# Altium footprint library ESKDPcbLib.PcbLib: 608 footprints (part 22 of 38)
Each footprint in its own frame and in the unit in brackets; x right, y up, seen from the top. Pads: shape width x height; smd on the part's side, far side on the other; paste and mask are expansions set on the pad; w line width, h text height; cw(c..) or ccw(c..) is an arc to the next point about the centre after c.
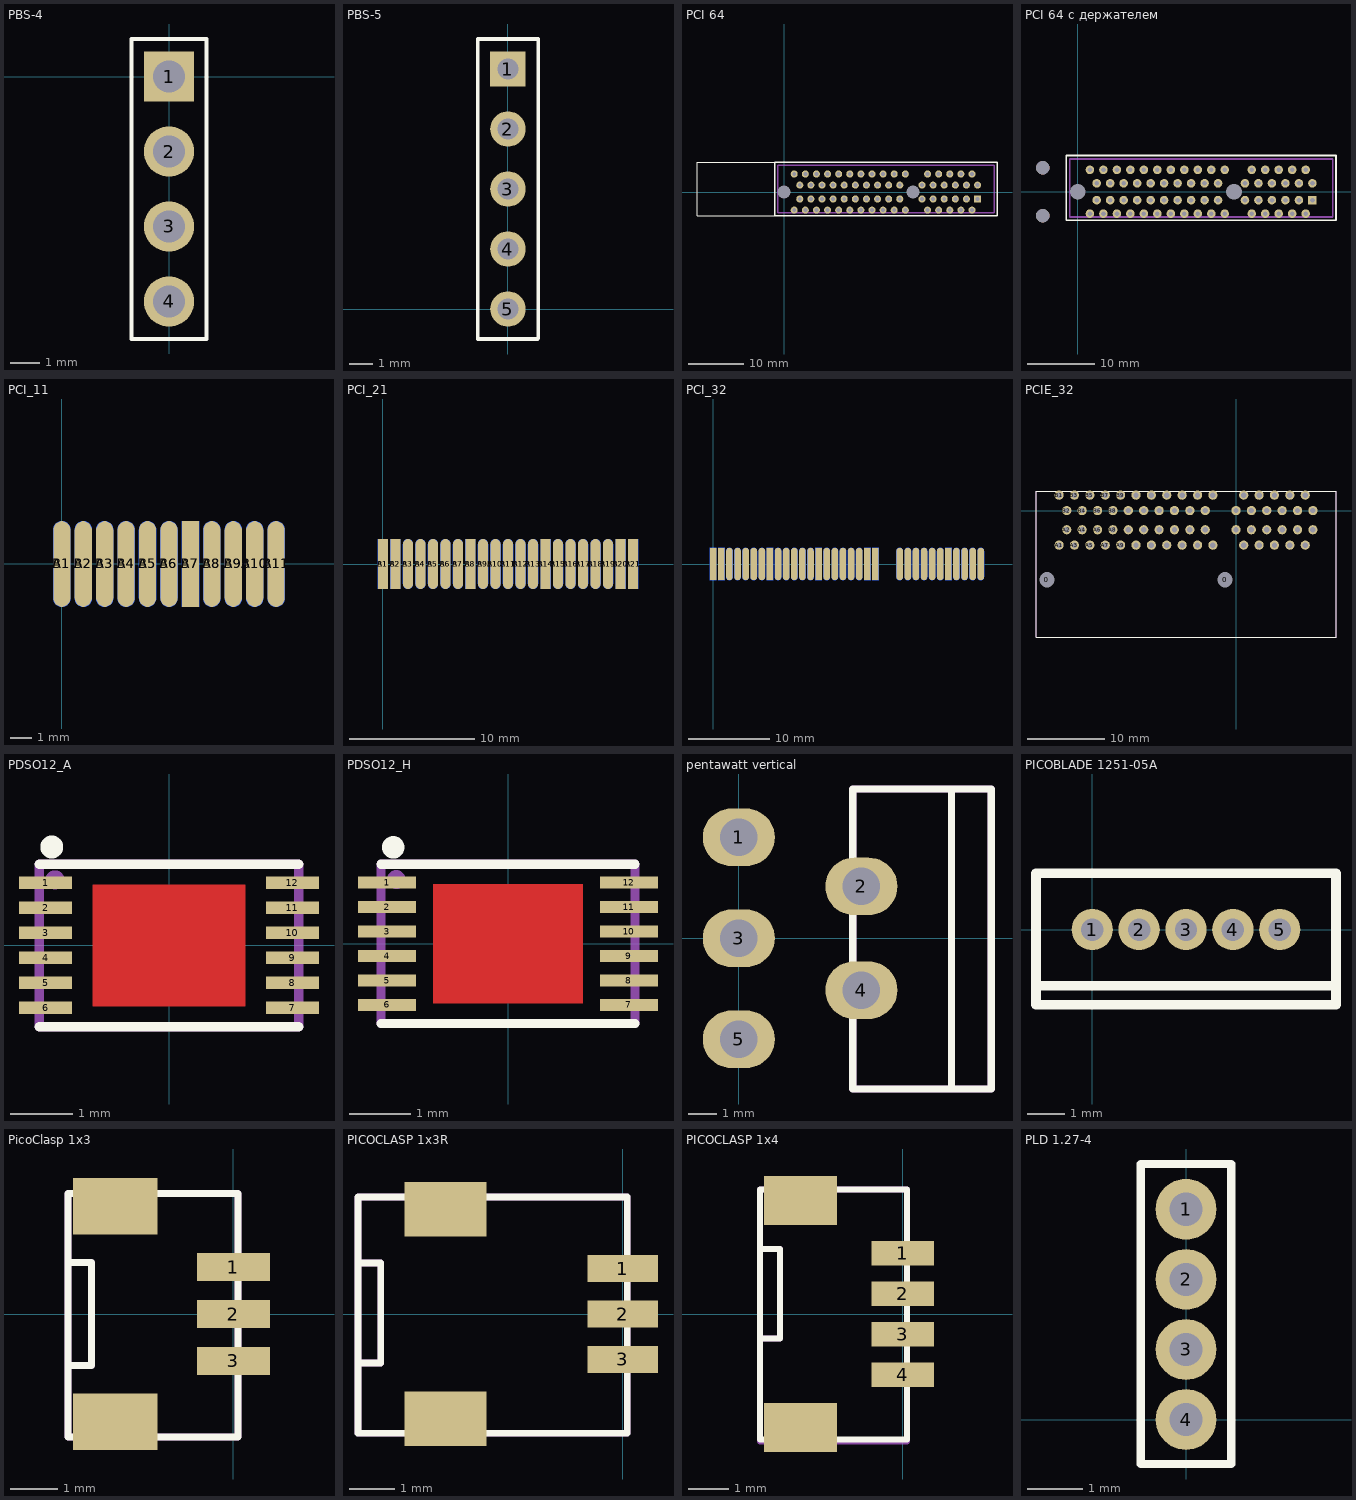
[diagram p21: the footprints below, top view; thin cyan lines are the x and y axes]

## PBS-4 [mm]
pads (4):
  rect 1.7x1.7 hole 1.1: 1(0,0)
  round 1.7 hole 1.1: 2(0,-2.54) 3(0,-5.08) 4(0,-7.62)
Top Overlay:
  lines w0.15: -1.27,-8.89 1.27,-8.89 1.27,1.27 -1.27,1.27 -1.27,-8.89
Mechanical 7:
  lines w0.1: -1.27,-8.89 1.27,-8.89 1.27,1.27 -1.27,1.27 -1.27,-8.89
Mechanical 10:
  text ".Designator" at -1.27,2.54 h1
  text ".Comment" at -1.27,3.81 h1
3D body: height 8.5, standoff 0.05, extent -1.27,-8.89 1.27,1.27

## PBS-5 [mm]
height 8.4
pads (5):
  rect 1.5x1.5 hole 0.9: 1(0,10.16)
  round 1.5 hole 0.9: 2(0,7.62) 3(0,5.08) 4(0,2.54) 5(0,0)
Top Overlay:
  lines w0.15: -1.27,-1.27 1.27,-1.27 ; -1.27,-1.245 -1.27,11.43 1.275,11.43 1.275,-1.245
Mechanical 7:
  lines w0.1: -1.27,-1.245 -1.27,11.43 1.275,11.43 1.275,-1.245 -1.27,-1.245
Mechanical 10:
  text ".Designator" at 0.73,12.7 h0.8
  text ".Comment" at 0.84,11.97 h0.6
3D body: height 6.02, standoff -3.1, extent -1.265,-1.27 1.275,11.43

## PCI 64 [mm]
pads (66):
  round 0.9 hole 2.35 unplated mask+0.975: 65(23.15,0) 66(0,0)
  rect 1.27x1.27 hole 0.7 mask+0.051: A1(34.8,-1.25)
  round 1.27 hole 0.7 mask+0.051: A2(33.8,-3.25) A3(32.8,-1.25) A4(31.8,-3.25) A5(30.8,-1.25) A6(29.8,-3.25) A7(28.8,-1.25) A8(27.8,-3.25) A9(26.8,-1.25) A10(25.8,-3.25) A11(24.8,-1.25) A12(21.8,-3.25) A13(20.8,-1.25) A14(19.8,-3.25) A15(18.8,-1.25) A16(17.8,-3.25) A17(16.8,-1.25) A18(15.8,-3.25) A19(14.8,-1.25) A20(13.8,-3.25) A21(12.8,-1.25) A22(11.8,-3.25) A23(10.8,-1.25) A24(9.8,-3.25) A25(8.8,-1.25) A26(7.8,-3.25) A27(6.8,-1.25) A28(5.8,-3.25) A29(4.8,-1.25) A30(3.8,-3.25) A31(2.8,-1.25) A32(1.8,-3.25) B1(34.8,1.25) B2(33.8,3.25) B3(32.8,1.25) B4(31.8,3.25) B5(30.8,1.25) B6(29.8,3.25) B7(28.8,1.25) B8(27.8,3.25) B9(26.8,1.25) B10(25.8,3.25) B11(24.8,1.25) B12(21.8,3.25) B13(20.8,1.25) B14(19.8,3.25) B15(18.8,1.25) B16(17.8,3.25) B17(16.8,1.25) B18(15.8,3.25) B19(14.8,1.25) B20(13.8,3.25) B21(12.8,1.25) B22(11.8,3.25) B23(10.8,1.25) B24(9.8,3.25) B25(8.8,1.25) B26(7.8,3.25) B27(6.8,1.25) B28(5.8,3.25) B29(4.8,1.25) B30(3.8,3.25) B31(2.8,1.25) B32(1.8,3.25)
Top Overlay:
  lines w0.2: -1.7,-4.25 -15.7,-4.25 -15.7,5.345 -15.685,5.36 -1.7,5.36
  lines w0.254: -1.7,-4.25 -1.7,5.36 38.3,5.36 38.3,-4.25 -1.7,-4.25
Mechanical 7:
  lines w0.254: -1.2,-3.75 -1.2,4.86 37.8,4.86 37.8,-3.75 -1.2,-3.75
Mechanical 10:
  text ".Comment" at 5.4,7.5 h1
  text ".Designator" at 5.4,6.4 h1
3D body: height 11.03, standoff -4.38, extent -1.194,-3.75 37.795,4.86

## PCI 64 с держателем [mm]
pads (68):
  round 0.9 hole 2.35 unplated mask+0.975: 65(23.15,0) 66(0,0)
  rect 1.27x1.27 hole 0.7 mask+0.051: A1(34.8,-1.25)
  round 1.27 hole 0.7 mask+0.051: A2(33.8,-3.25) A3(32.8,-1.25) A4(31.8,-3.25) A5(30.8,-1.25) A6(29.8,-3.25) A7(28.8,-1.25) A8(27.8,-3.25) A9(26.8,-1.25) A10(25.8,-3.25) A11(24.8,-1.25) A12(21.8,-3.25) A13(20.8,-1.25) A14(19.8,-3.25) A15(18.8,-1.25) A16(17.8,-3.25) A17(16.8,-1.25) A18(15.8,-3.25) A19(14.8,-1.25) A20(13.8,-3.25) A21(12.8,-1.25) A22(11.8,-3.25) A23(10.8,-1.25) A24(9.8,-3.25) A25(8.8,-1.25) A26(7.8,-3.25) A27(6.8,-1.25) A28(5.8,-3.25) A29(4.8,-1.25) A30(3.8,-3.25) A31(2.8,-1.25) A32(1.8,-3.25) B1(34.8,1.25) B2(33.8,3.25) B3(32.8,1.25) B4(31.8,3.25) B5(30.8,1.25) B6(29.8,3.25) B7(28.8,1.25) B8(27.8,3.25) B9(26.8,1.25) B10(25.8,3.25) B11(24.8,1.25) B12(21.8,3.25) B13(20.8,1.25) B14(19.8,3.25) B15(18.8,1.25) B16(17.8,3.25) B17(16.8,1.25) B18(15.8,3.25) B19(14.8,1.25) B20(13.8,3.25) B21(12.8,1.25) B22(11.8,3.25) B23(10.8,1.25) B24(9.8,3.25) B25(8.8,1.25) B26(7.8,3.25) B27(6.8,1.25) B28(5.8,3.25) B29(4.8,1.25) B30(3.8,3.25) B31(2.8,1.25) B32(1.8,3.25)
  round 2 hole 2 unplated: ""(-5.2,-3.555) ""(-5.2,3.555)
Top Overlay:
  lines w0.254: -1.7,-4.25 -1.7,5.36 38.3,5.36 38.3,-4.25 -1.7,-4.25
Mechanical 1:
  lines w0.254: -1.2,-3.75 -1.2,4.86 37.8,4.86 37.8,-3.75 -1.2,-3.75
3D body: height 11.03, standoff -4.38, extent -1.194,-3.75 37.795,4.86

## PCI_11 [mm]
pads (22):
  oval 0.8x4 smd: A1(0,0) A2(1,0) A3(2,0) A4(3,0) A5(4,0) A6(5,0) A8(7,0) A9(8,0) A10(9,0) A11(10,0)
  rect 0.8x4 smd: A7(6,0)
  oval 0.8x4 smd far side: B1(0,0) B2(1,0) B3(2,0) B4(3,0) B5(4,0) B6(5,0) B8(7,0) B9(8,0) B10(9,0) B11(10,0)
  rect 0.8x4 smd far side: B7(6,0)

## PCI_21 [mm]
pads (42):
  rect 0.8x4 smd: A1(0,0) A2(1,0) A8(7,0) A14(13,0) A20(19,0) A21(20,0)
  oval 0.8x4 smd: A3(2,0) A4(3,0) A5(4,0) A6(5,0) A7(6,0) A9(8,0) A10(9,0) A11(10,0) A12(11,0) A13(12,0) A15(14,0) A16(15,0) A17(16,0) A18(17,0) A19(18,0)
  rect 0.8x4 smd far side: B1(0,0) B2(1,0) B8(7,0) B14(13,0) B20(19,0) B21(20,0)
  oval 0.8x4 smd far side: B3(2,0) B4(3,0) B5(4,0) B6(5,0) B7(6,0) B9(8,0) B10(9,0) B11(10,0) B12(11,0) B13(12,0) B15(14,0) B16(15,0) B17(16,0) B18(17,0) B19(18,0)

## PCI_32 [mm]
pads (64):
  rect 0.8x4 smd: A1(0,0) A2(1,0) A8(7,0) A14(13,0) A20(19,0) A21(20,0) A28(29,0)
  oval 0.8x4 smd: A3(2,0) A4(3,0) A5(4,0) A6(5,0) A7(6,0) A9(8,0) A10(9,0) A11(10,0) A12(11,0) A13(12,0) A15(14,0) A16(15,0) A17(16,0) A18(17,0) A19(18,0) A22(23,0) A23(24,0) A24(25,0) A25(26,0) A26(27,0) A27(28,0) A29(30,0) A30(31,0) A31(32,0) A32(33,0)
  rect 0.8x4 smd far side: B1(0,0) B2(1,0) B8(7,0) B14(13,0) B20(19,0) B21(20,0) B28(29,0)
  oval 0.8x4 smd far side: B3(2,0) B4(3,0) B5(4,0) B6(5,0) B7(6,0) B9(8,0) B10(9,0) B11(10,0) B12(11,0) B13(12,0) B15(14,0) B16(15,0) B17(16,0) B18(17,0) B19(18,0) B22(23,0) B23(24,0) B24(25,0) B25(26,0) B26(27,0) B27(28,0) B29(30,0) B30(31,0) B31(32,0) B32(33,0)

## PCIE_32 [mm]
pads (66):
  round 1.2 hole 2: 0(-24.575,-9) 0(-1.425,-9)
  round 1.2 hole 0.7: A1(-23,-4.5) A2(-22,-2.5) A3(-21,-4.5) A4(-20,-2.5) A5(-19,-4.5) A6(-18,-2.5) A7(-17,-4.5) A8(-16,-2.5) A9(-15,-4.5) A10(-14,-2.5) A11(-13,-4.5) A12(-12,-2.5) A13(-11,-4.5) A14(-10,-2.5) A15(-9,-4.5) A16(-8,-2.5) A17(-7,-4.5) A18(-6,-2.5) A19(-5,-4.5) A20(-4,-2.5) A21(-3,-4.5) A22(0,-2.5) A23(1,-4.5) A24(2,-2.5) A25(3,-4.5) A26(4,-2.5) A27(5,-4.5) A28(6,-2.5) A29(7,-4.5) A30(8,-2.5) A31(9,-4.5) A32(10,-2.5) B1(-23,2) B2(-22,0) B3(-21,2) B4(-20,0) B5(-19,2) B6(-18,0) B7(-17,2) B8(-16,0) B9(-15,2) B10(-14,0) B11(-13,2) B12(-12,0) B13(-11,2) B14(-10,0) B15(-9,2) B16(-8,0) B17(-7,2) B18(-6,0) B19(-5,2) B20(-4,0) B21(-3,2) B22(0,0) B23(1,2) B24(2,0) B25(3,2) B26(4,0) B27(5,2) B28(6,0) B29(7,2) B30(8,0) B31(9,2) B32(10,0)
Top Overlay:
  lines w0.1: -26,-16.5 -26,2.5 13,2.5 13,-16.5 -26,-16.5
Mechanical 7:
  lines w0.1: -26,-16.5 13,-16.5 13,2.5 -26,2.5 -26,-16.5
3D body: height 8, standoff 0, extent -26,-6 13,2.5
3D body: height 9.45, standoff 0, extent -26,-16.5 13,-6

## PDSO12_A [mm]
pads (12):
  rect 0.85x0.2 smd: 1(-1.975,1) 2(-1.975,0.6) 3(-1.975,0.2) 4(-1.975,-0.2) 5(-1.975,-0.6) 6(-1.975,-1) 7(1.975,-1) 8(1.975,-0.6) 9(1.975,-0.2) 10(1.975,0.2) 11(1.975,0.6) 12(1.975,1)
Top Layer:
  rectangle: -1.225,-0.975 1.225,0.975
Top Overlay:
  circle w0.254: c-1.875,1.575 r0.056
  lines w0.15: -2.075,-1.3 2.075,-1.3 ; -2.075,1.3 2.075,1.3
Mechanical 7:
  circle w0.254: c-1.825,1.05 r0.025
  lines w0.15: -2.075,-1.3 -2.075,1.3 2.075,1.3 2.075,-1.3 -2.075,-1.3
Mechanical 10:
  text ".Designator" at 0.575,2.1 h0.8
  text ".Comment" at 0.525,1.575 h0.6
3D body: height 1, standoff 0, extent -2.075,-1.3 2.075,1.3

## PDSO12_H [mm]
pads (12):
  rect 0.95x0.2 smd: 1(-1.975,1) 2(-1.975,0.6) 3(-1.975,0.2) 4(-1.975,-0.2) 5(-1.975,-0.6) 6(-1.975,-1) 7(1.975,-1) 8(1.975,-0.6) 9(1.975,-0.2) 10(1.975,0.2) 11(1.975,0.6) 12(1.975,1)
Top Layer:
  rectangle: -1.225,-0.975 1.225,0.975
Top Overlay:
  circle w0.254: c-1.875,1.575 r0.056
  lines w0.15: -2.075,-1.3 2.075,-1.3 ; -2.075,1.3 2.075,1.3
Mechanical 7:
  circle w0.254: c-1.825,1.05 r0.025
  lines w0.15: -2.075,-1.3 2.075,-1.3 2.075,1.3 -2.075,1.3 -2.075,-1.3
Mechanical 10:
  text ".Comment" at 0.525,1.575 h0.6
  text ".Designator" at 0.575,2.1 h0.8
3D body: height 1, standoff 0, extent -2.075,-1.3 2.075,1.3

## pentawatt vertical [mm]
pads (5):
  oval 2.5x2 hole 1.3: 1(0,3.5) 2(4.25,1.8) 3(0,0) 4(4.25,-1.8) 5(0,-3.5)
Top Overlay:
  lines w0.254: 8.75,-5.225 7.375,-5.225 7.375,5.175 8.75,5.175 ; 8.75,-5.225 8.75,5.175 ; 8.75,-5.225 3.95,-5.225 3.95,5.175 8.75,5.175
Mechanical 7:
  lines w0.254: 8.75,-5.225 3.95,-5.225 3.95,5.175 8.75,5.175 ; 8.75,-5.225 8.75,5.175 ; 8.75,-5.225 7.375,-5.225 7.375,5.175 8.75,5.175
Mechanical 10:
  text ".Designator" at 6.425,7.425 h1.5
  text ".Comment" at 6.295,5.965 h1.5
3D body "PENTAWATT.step": height 26.08, standoff 0.78, extent 0.001,-5.2 8.075,5.2

## PICOBLADE 1251-05A [mm]
pads (5):
  round 1.1 hole 0.6 mask+0: 1(0,0) 2(1.25,0) 3(2.5,0) 4(3.75,0) 5(5,0)
Top Overlay:
  lines w0.254: -1.5,-1.5 6.5,-1.5 ; -1.5,-2 -1.5,1.5 6.5,1.5 6.5,-2 -1.5,-2

## PicoClasp 1x3 [mm]
pads (5):
  rect 1.55x0.6 smd: 1(0,1) 2(0,0) 3(0,-1)
  rect 1.8x1.2 smd: ""(-2.525,-2.3) ""(-2.525,2.3)
Top Overlay:
  lines w0.15: -3.525,-1.1 -3.025,-1.1 -3.025,1.1 -3.525,1.1 ; -3.525,-2.625 0.1,-2.625 0.1,2.575 -3.525,2.575 -3.525,-2.625
Mechanical 7:
  lines w0.15: -3.525,-1.075 -3.5,-1.1 -3.025,-1.1 -3.025,1.1 -3.525,1.1 ; -3.525,-2.625 0.1,-2.625 0.1,2.575 -3.525,2.575 -3.525,-2.625
Mechanical 10:
  text ".Designator" at -4,5 h1.52
  text ".Comment" at -4,4 h1.52
3D body: height 5.45, standoff 0, extent -3.5,-2.62 0.1,2.62

## PICOCLASP 1x3R [mm]
pads (5):
  rect 1.55x0.6 smd: 1(0,1) 2(0,0) 3(0,-1)
  rect 1.8x1.2 smd: ""(-3.9,-2.3) ""(-3.9,2.3)
Top Overlay:
  lines w0.15: -5.825,-1.075 -5.325,-1.075 -5.325,1.125 -5.825,1.125 ; -5.825,-2.625 0.1,-2.625 0.1,2.575 -5.825,2.575 -5.825,-2.625
Mechanical 7:
  lines w0.15: -5.825,1.125 -5.325,1.125 -5.325,-1.075 -5.8,-1.075 ; -5.825,-2.625 0.1,-2.625 0.1,2.575 -5.825,2.575 -5.825,-2.625
Mechanical 10:
  text ".Designator" at -4,5 h1.52
  text ".Comment" at -4,4 h1.52
3D body: height 3.25, standoff 0.05, extent -5.875,-2.5 0.025,2.5

## PICOCLASP 1x4 [mm]
pads (6):
  rect 1.55x0.6 smd: 1(0,1.5) 2(0,0.5) 3(0,-0.5) 4(0,-1.5)
  rect 1.8x1.2 smd: ""(-2.525,-2.8) ""(-2.525,2.8)
Top Overlay:
  lines w0.15: -3.525,-0.6 -3.025,-0.6 -3.025,1.6 -3.525,1.6 ; -3.525,-3.1 0.1,-3.1 0.1,3.075 -3.525,3.075 -3.525,-3.1
Mechanical 7:
  lines w0.15: -3.525,-0.575 -3.5,-0.6 -3.025,-0.6 -3.025,1.6 -3.525,1.6 ; -3.525,-3.15 0.1,-3.15 0.1,3.075 -3.525,3.075 -3.525,-3.15
3D body: height 5.45, standoff 0, extent -3.525,-3.17 0.075,3.07

## PLD 1.27-4 [mm]
pads (4):
  round 1.1 hole 0.6: 1(0,3.81) 2(0,2.54) 3(0,1.27) 4(0,0)
Top Overlay:
  lines w0.15: -0.82,-0.805 0.82,-0.805 0.82,4.63 -0.82,4.63 -0.82,-0.805
Mechanical 7:
  lines w0.1: -0.82,-0.805 -0.82,4.63 0.82,4.63 0.82,-0.805 -0.82,-0.805
Mechanical 10:
  text ".Comment" at 3.985,-2.06 h0.6
  text ".Designator" at 3.925,5.86 h0.8
3D body: height 0.05, standoff 0, extent -0.82,-0.805 0.82,4.63